# Altium footprint library ICL_connectors_v1.PcbLib: 86 footprints (part 4 of 6)
Each footprint in its own frame and in the unit in brackets; x right, y up, seen from the top. Pads: shape width x height; smd on the part's side, far side on the other; paste and mask are expansions set on the pad; w line width, h text height; cw(c..) or ccw(c..) is an arc to the next point about the centre after c.
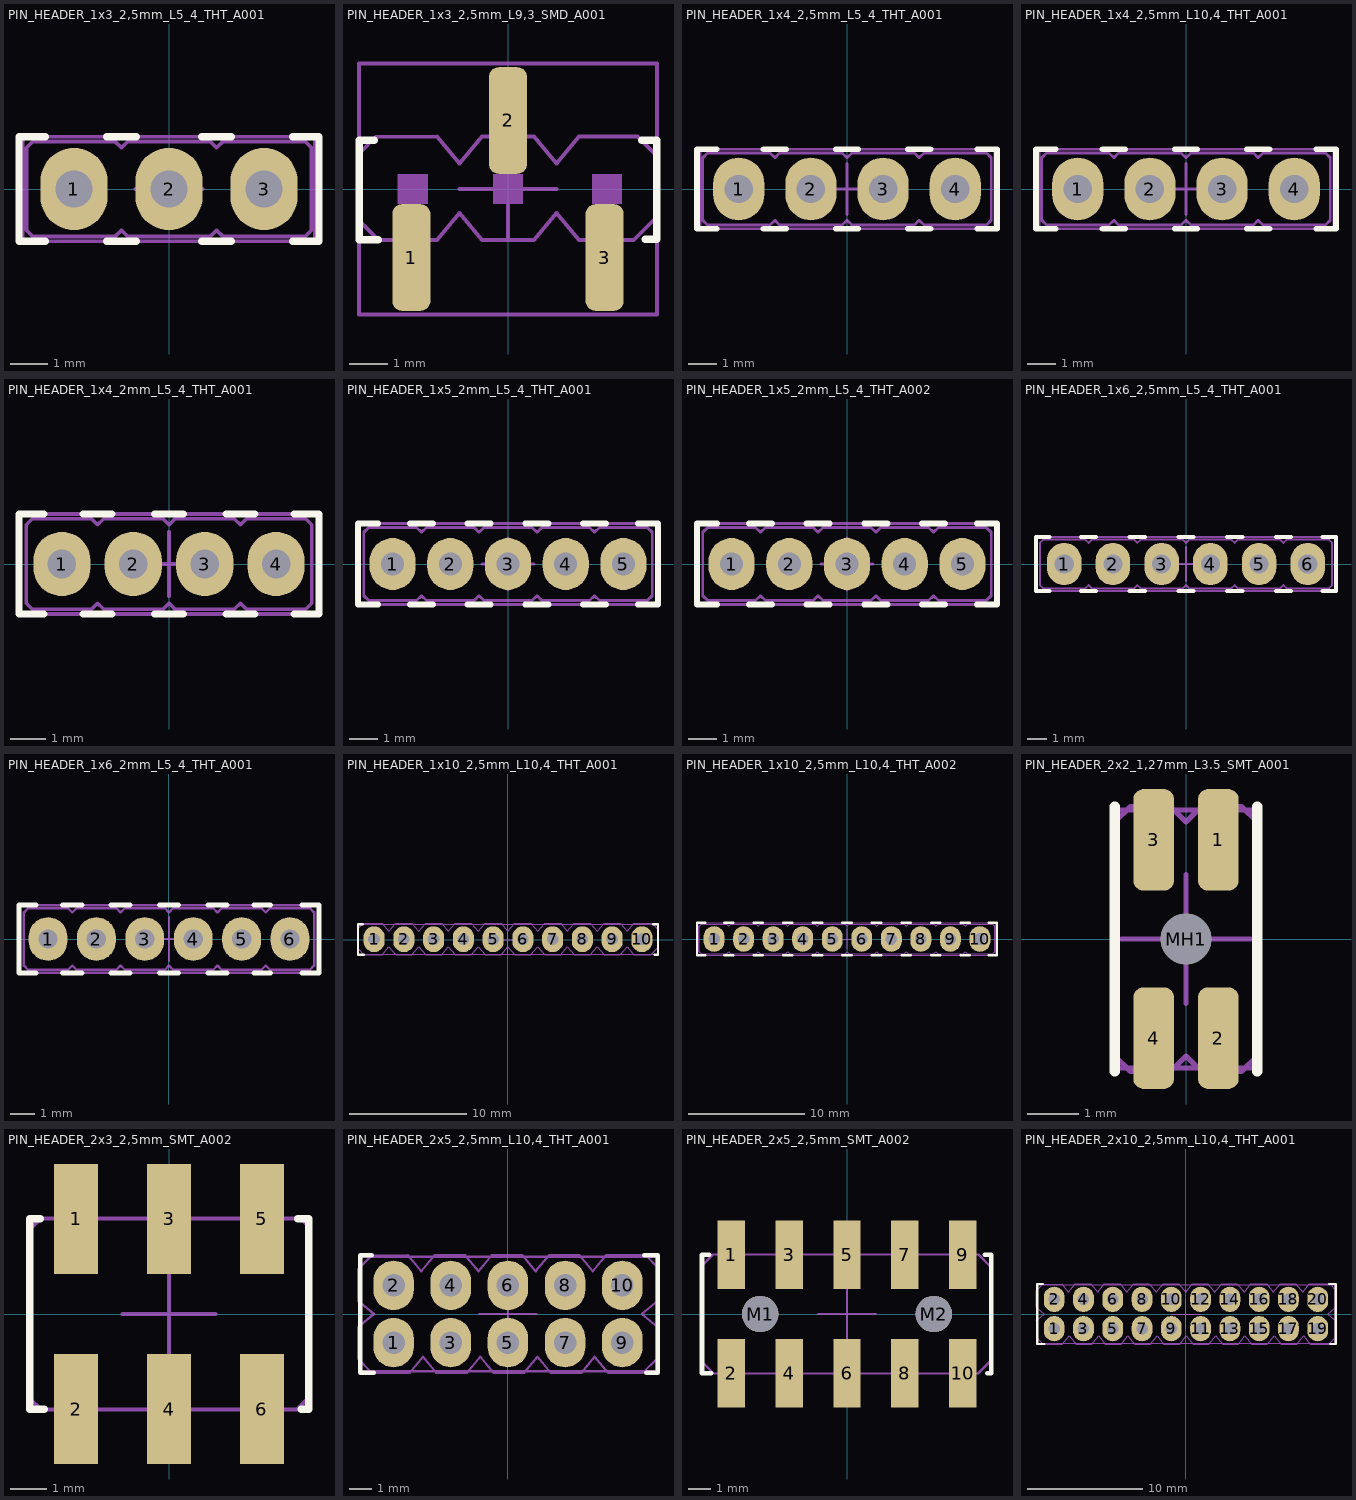
[diagram p3: the footprints below, top view; thin cyan lines are the x and y axes]

## PIN_HEADER_1x3_2,5mm_L5_4_THT_A001 [mm]
pads (3):
  oval 1.8x2.2 hole 1 paste-1: 1(-2.54,0) 2(0,0) 3(2.54,0)
Top Overlay:
  lines w0.2: -3.31,-1.4 -4.01,-1.4 -4.01,1.4 -3.31,1.4 ; -1.67,-1.4 -0.87,-1.4 ; -1.67,1.4 -0.87,1.4 ; 0.87,-1.4 1.67,-1.4 ; 0.87,1.4 1.67,1.4 ; 3.31,-1.4 4.01,-1.4 4.01,1.4 3.31,1.4
Top M15-16_SORG:
  lines w0.1: -0.9,0 0.9,0 ; 0,-0.9 0,0.9 ; -3.91,-1.4 3.9,-1.4 3.9,1.4 -3.91,1.4 -3.91,-1.4
Top M17-18_TDES:
  text "'.Designator'" at -5.665,2.183 h1
Top M19-20_TMOT:
  lines w0.1: -3.81,-1.1 -3.81,1.1 -3.64,1.27 -1.44,1.27 -1.27,1.1 -1.1,1.27 1.1,1.27 1.27,1.1 1.44,1.27 3.64,1.27 3.81,1.1 3.81,-1.1 3.64,-1.27 1.44,-1.27 1.27,-1.1 1.1,-1.27 -1.1,-1.27 -1.27,-1.1 -1.44,-1.27 -3.64,-1.27 -3.81,-1.1
3D body "color1x3 TH Pitch 2_54mm.stp": height 9.51, standoff -3.19, extent -3.81,-1.27 3.81,1.27

## PIN_HEADER_1x3_2,5mm_L9,3_SMD_A001 [mm]
pads (3):
  rrect50% 1x2.8 smd paste-1: 1(-2.54,-1.8) 2(0,1.8) 3(2.54,-1.8)
Top Overlay:
  lines w0.2: -3.51,1.278 -3.91,1.278 -3.91,-1.333 -3.41,-1.333 ; 3.51,1.285 3.91,1.285 3.91,-1.32 3.61,-1.32
Top M11-12_SMOT:
  rectangle: -0.3,1.4 0.3,2.7
  rectangle: -0.4,-0.4 0.4,0.4
  rectangle: 2.2,-0.4 3,0.4
  rectangle: -2.9,-0.4 -2.1,0.4
  region: 2.84,-1.338 2.24,-1.338 2.24,-2.7 2.84,-2.7
  region: -2.24,-1.338 -2.84,-1.338 -2.84,-2.7 -2.24,-2.7
  lines w0.1: -3.913,-0.827 -3.903,0.939 -3.472,1.372 -1.86,1.378 -1.27,0.67 -0.68,1.378 0.68,1.378 1.27,0.67 1.86,1.378 3.405,1.378 3.915,0.864 3.908,-0.732 3.302,-1.338 1.86,-1.338 1.27,-0.63 0.68,-1.338 -0.68,-1.338 -1.27,-0.63 -1.86,-1.338 -3.402,-1.338 -3.913,-0.827
Top M13-14_SDES:
  text "'.Designator'" at -5.665,4.283 h1
Top M15-16_SORG:
  lines w0.1: -1.27,0 0,0 ; 0,-1.27 0,0 ; 0,1.27 0,0 ; 1.27,0 0,0 ; -3.91,-3.3 3.91,-3.3 3.91,3.3 -3.91,3.3 -3.91,-3.3
3D body "pin_header_a-sl254-eg-g03mr1.stp": height 9.85, standoff 0.01, extent -3.81,-2.5 3.81,2.5

## PIN_HEADER_1x4_2,5mm_L5_4_THT_A001 [mm]
pads (4):
  oval 1.8x2.2 hole 1 paste-1: 1(-3.81,0) 2(-1.27,0) 3(1.27,0) 4(3.81,0)
Top Overlay:
  lines w0.2: -4.58,-1.4 -5.28,-1.4 -5.28,1.4 -4.58,1.4 ; -2.94,-1.4 -2.14,-1.4 ; -2.94,1.4 -2.14,1.4 ; -0.4,-1.4 0.4,-1.4 ; -0.4,1.4 0.4,1.4 ; 2.14,-1.4 2.94,-1.4 ; 2.14,1.4 2.94,1.4 ; 4.58,-1.4 5.28,-1.4 5.28,1.4 4.58,1.4
Top M15-16_SORG:
  lines w0.1: -0.9,0 0.9,0 ; 0,-0.9 0,0.9 ; -5.18,-1.4 5.2,-1.4 5.2,1.4 -5.18,1.4 -5.18,-1.4
Top M17-18_TDES:
  text "'.Designator'" at -5.665,2.183 h1
Top M19-20_TMOT:
  lines w0.1: -5.08,-1.1 -5.08,1.1 -4.91,1.27 -2.71,1.27 -2.54,1.1 -2.37,1.27 -0.17,1.27 0,1.1 0.17,1.27 2.37,1.27 2.54,1.1 2.71,1.27 4.91,1.27 5.08,1.1 5.08,-1.1 4.91,-1.27 2.71,-1.27 2.54,-1.1 2.37,-1.27 0.17,-1.27 0,-1.1 -0.17,-1.27 -2.37,-1.27 -2.54,-1.1 -2.71,-1.27 -4.91,-1.27 -5.08,-1.1
3D body "Header 4 Vertical.step": height 8.14, standoff -2.71, extent -4.872,-1.171 4.882,1.165

## PIN_HEADER_1x4_2,5mm_L10,4_THT_A001 [mm]
pads (4):
  oval 1.8x2.2 hole 1 paste-1: 1(-3.81,0) 2(-1.27,0) 3(1.27,0) 4(3.81,0)
Top Overlay:
  lines w0.2: -4.58,-1.4 -5.28,-1.4 -5.28,1.4 -4.58,1.4 ; -2.94,-1.4 -2.14,-1.4 ; -2.94,1.4 -2.14,1.4 ; -0.4,-1.4 0.4,-1.4 ; -0.4,1.4 0.4,1.4 ; 2.14,-1.4 2.94,-1.4 ; 2.14,1.4 2.94,1.4 ; 4.58,-1.4 5.28,-1.4 5.28,1.4 4.58,1.4
Top M15-16_SORG:
  lines w0.1: -0.9,0 0.9,0 ; 0,-0.9 0,0.9 ; -5.18,-1.4 -5.18,1.4 5.2,1.4 5.2,-1.4 -5.18,-1.4
Top M17-18_TDES:
  text "'.Designator'" at -5.665,2.183 h1
Top M19-20_TMOT:
  lines w0.1: -5.08,-1.1 -4.91,-1.27 -2.71,-1.27 -2.54,-1.1 -2.37,-1.27 -0.17,-1.27 0,-1.1 0.17,-1.27 2.37,-1.27 2.54,-1.1 2.71,-1.27 4.91,-1.27 5.08,-1.1 5.08,1.1 4.91,1.27 2.71,1.27 2.54,1.1 2.37,1.27 0.17,1.27 0,1.1 -0.17,1.27 -2.37,1.27 -2.54,1.1 -2.71,1.27 -4.91,1.27 -5.08,1.1 -5.08,-1.1
3D body "PIN_HEADER_2_54_1x4_double.stp": height 16.41, standoff -2.99, extent -5.06,-1.27 5.06,1.27

## PIN_HEADER_1x4_2mm_L5_4_THT_A001 [mm]
pads (4):
  oval 1.6x1.8 hole 0.8 paste-1: 1(-3,0) 2(-1,0) 3(1,0) 4(3,0)
Top Overlay:
  lines w0.2: -3.5,-1.4 -4.2,-1.4 -4.2,1.4 -3.5,1.4 ; -2.4,-1.4 -1.6,-1.4 ; -2.4,1.4 -1.6,1.4 ; -0.4,-1.4 0.4,-1.4 ; -0.4,1.4 0.4,1.4 ; 1.6,-1.4 2.4,-1.4 ; 1.6,1.4 2.4,1.4 ; 3.5,-1.4 4.2,-1.4 4.2,1.4 3.5,1.4
Top M15-16_SORG:
  lines w0.1: -0.9,0 0.9,0 ; 0,-0.9 0,0.9 ; -4.2,-1.4 4.2,-1.4 4.2,1.4 -4.2,1.4 -4.2,-1.4
Top M17-18_TDES:
  text "'.Designator'" at -5.665,2.183 h1
Top M19-20_TMOT:
  lines w0.1: -1.83,1.27 -2,1.1 -2.17,1.27 -3.83,1.27 -4,1.1 -4,-1.1 -3.83,-1.27 -2.17,-1.27 -2,-1.1 -1.83,-1.27 -0.17,-1.27 0,-1.1 0.17,-1.27 1.83,-1.27 2,-1.1 2.17,-1.27 3.83,-1.27 4,-1.1 4,1.1 3.83,1.27 2.17,1.27 2,1.1 1.83,1.27 0.17,1.27 0,1.1 -0.17,1.27 -1.83,1.27 ; -1.83,1.27 -1.83,1.27
3D body "Download_STP_62000411121 (rev1).stp": height 6.01, standoff -2.69, extent -4,-1 4,1

## PIN_HEADER_1x5_2mm_L5_4_THT_A001 [mm]
pads (5):
  oval 1.6x1.8 hole 0.8 paste-1: 1(-4,0) 2(-2,0) 3(0,0) 4(2,0) 5(4,0)
Top Overlay:
  lines w0.2: -4.5,-1.4 -5.2,-1.4 -5.2,1.4 -4.5,1.4 ; -3.4,-1.4 -2.6,-1.4 ; -3.4,1.4 -2.6,1.4 ; -1.4,-1.4 -0.6,-1.4 ; -1.4,1.4 -0.6,1.4 ; 0.6,-1.4 1.4,-1.4 ; 0.6,1.4 1.4,1.4 ; 2.6,-1.4 3.4,-1.4 ; 2.6,1.4 3.4,1.4 ; 4.5,-1.4 5.2,-1.4 5.2,1.4 4.5,1.4
Top M15-16_SORG:
  lines w0.1: -0.9,0 0.9,0 ; 0,-0.9 0,0.9 ; -5.2,-1.4 -5.2,1.4 5.2,1.4 5.2,-1.4 -5.2,-1.4
Top M17-18_TDES:
  text "'.Designator'" at -5.865,2.083 h1
Top M19-20_TMOT:
  lines w0.1: -2.83,1.27 -1.17,1.27 -1,1.1 -0.83,1.27 0.83,1.27 1,1.1 1.17,1.27 2.83,1.27 3,1.1 3.17,1.27 4.83,1.27 5,1.1 5,-1.1 4.83,-1.27 3.17,-1.27 3,-1.1 2.83,-1.27 1.17,-1.27 1,-1.1 0.83,-1.27 -0.83,-1.27 -1,-1.1 -1.17,-1.27 -2.83,-1.27 -3,-1.1 -3.17,-1.27 -4.83,-1.27 -5,-1.1 -5,1.1 -4.83,1.27 -3.17,1.27 -3,1.1 -2.83,1.27 ; -2.83,1.27 -2.83,1.27
3D body "Download_STP_62000411121 (rev1).stp": height 6.01, standoff -2.69, extent -3,-1 5,1
3D body "Download_STP_62000411121 (rev1).stp": height 6.01, standoff -2.69, extent -5,-1 3,1

## PIN_HEADER_1x5_2mm_L5_4_THT_A002 [mm]
pads (5):
  oval 1.6x1.8 hole 0.8 paste-1: 1(-4,0) 2(-2,0) 3(0,0) 4(2,0) 5(4,0)
Top Overlay:
  lines w0.2: -4.5,-1.4 -5.2,-1.4 -5.2,1.4 -4.5,1.4 ; -3.4,-1.4 -2.6,-1.4 ; -3.4,1.4 -2.6,1.4 ; -1.4,-1.4 -0.6,-1.4 ; -1.4,1.4 -0.6,1.4 ; 0.6,-1.4 1.4,-1.4 ; 0.6,1.4 1.4,1.4 ; 2.6,-1.4 3.4,-1.4 ; 2.6,1.4 3.4,1.4 ; 4.5,-1.4 5.2,-1.4 5.2,1.4 4.5,1.4
Top M15-16_SORG:
  lines w0.1: -0.9,0 0.9,0 ; 0,-0.9 0,0.9 ; -5.2,-1.4 -5.2,1.4 5.2,1.4 5.2,-1.4 -5.2,-1.4
Top M17-18_TDES:
  text "'.Designator'" at -5.865,2.083 h1
Top M19-20_TMOT:
  lines w0.1: -2.83,1.27 -1.17,1.27 -1,1.1 -0.83,1.27 0.83,1.27 1,1.1 1.17,1.27 2.83,1.27 3,1.1 3.17,1.27 4.83,1.27 5,1.1 5,-1.1 4.83,-1.27 3.17,-1.27 3,-1.1 2.83,-1.27 1.17,-1.27 1,-1.1 0.83,-1.27 -0.83,-1.27 -1,-1.1 -1.17,-1.27 -2.83,-1.27 -3,-1.1 -3.17,-1.27 -4.83,-1.27 -5,-1.1 -5,1.1 -4.83,1.27 -3.17,1.27 -3,1.1 -2.83,1.27 ; -2.83,1.27 -2.83,1.27
3D body: height 1, standoff 0, extent 3.5,-0.5 4.5,0.5
3D body: height 1, standoff 0, extent 1.5,-0.5 2.5,0.5
3D body: height 1, standoff 0, extent -0.5,-0.5 0.5,0.5
3D body: height 1, standoff 0, extent -2.5,-0.5 -1.5,0.5
3D body: height 1, standoff 0, extent -4.5,-0.5 -3.5,0.5

## PIN_HEADER_1x6_2,5mm_L5_4_THT_A001 [mm]
pads (6):
  oval 1.8x2.2 hole 1 paste-1: 1(-6.35,0) 2(-3.81,0) 3(-1.27,0) 4(1.27,0) 5(3.81,0) 6(6.35,0)
Top Overlay:
  lines w0.2: -7.12,-1.4 -7.82,-1.4 -7.82,1.4 -7.12,1.4 ; -5.48,-1.4 -4.68,-1.4 ; -5.48,1.4 -4.68,1.4 ; -2.94,-1.4 -2.14,-1.4 ; -2.94,1.4 -2.14,1.4 ; -0.4,-1.4 0.4,-1.4 ; -0.4,1.4 0.4,1.4 ; 2.14,-1.4 2.94,-1.4 ; 2.14,1.4 2.94,1.4 ; 4.68,-1.4 5.48,-1.4 ; 4.68,1.4 5.48,1.4 ; 7.12,-1.4 7.82,-1.4 7.82,1.4 7.12,1.4
Top M15-16_SORG:
  lines w0.1: -0.9,0 0.9,0 ; 0,-0.9 0,0.9 ; -7.8,-1.4 -7.8,1.4 7.8,1.4 7.8,-1.4 -7.8,-1.4
Top M17-18_TDES:
  text "'.Designator'" at -5.665,2.183 h1
Top M19-20_TMOT:
  lines w0.1: -7.62,-1.1 -7.45,-1.27 -5.25,-1.27 -5.08,-1.1 -4.91,-1.27 -2.71,-1.27 -2.54,-1.1 -2.37,-1.27 -0.17,-1.27 0,-1.1 0.17,-1.27 2.37,-1.27 2.54,-1.1 2.71,-1.27 4.91,-1.27 5.08,-1.1 5.25,-1.27 7.45,-1.27 7.62,-1.1 7.62,1.1 7.45,1.27 5.25,1.27 5.08,1.1 4.91,1.27 2.71,1.27 2.54,1.1 2.37,1.27 0.17,1.27 0,1.1 -0.17,1.27 -2.37,1.27 -2.54,1.1 -2.71,1.27 -4.91,1.27 -5.08,1.1 -5.25,1.27 -7.45,1.27 -7.62,1.1 -7.62,-1.1
3D body "Header 4 Vertical.step": height 8.14, standoff -2.71, extent -7.412,-1.171 2.342,1.165
3D body "Header 4 Vertical.step": height 8.14, standoff -2.71, extent -2.332,-1.171 7.422,1.165

## PIN_HEADER_1x6_2mm_L5_4_THT_A001 [mm]
pads (6):
  oval 1.6x1.8 hole 0.8 paste-1: 1(-5,0) 2(-3,0) 3(-1,0) 4(1,0) 5(3,0) 6(5,0)
Top Overlay:
  lines w0.2: -5.5,-1.4 -6.2,-1.4 -6.2,1.4 -5.5,1.4 ; -4.4,-1.4 -3.6,-1.4 ; -4.4,1.4 -3.6,1.4 ; -2.4,-1.4 -1.6,-1.4 ; -2.4,1.4 -1.6,1.4 ; -0.4,-1.4 0.4,-1.4 ; -0.4,1.4 0.4,1.4 ; 1.6,-1.4 2.4,-1.4 ; 1.6,1.4 2.4,1.4 ; 3.5,-1.4 4.2,-1.4 ; 3.5,1.4 4.2,1.4 ; 5.5,-1.4 6.2,-1.4 6.2,1.4 5.5,1.4
Top M15-16_SORG:
  lines w0.1: -0.9,0 0.9,0 ; 0,-0.9 0,0.9 ; -6.2,-1.4 -6.2,1.4 6.2,1.4 6.2,-1.4 -6.2,-1.4
Top M17-18_TDES:
  text "'.Designator'" at -5.665,2.083 h1
Top M19-20_TMOT:
  lines w0.1: -3.83,1.27 -2.17,1.27 -2,1.1 -1.83,1.27 -0.17,1.27 0,1.1 0.17,1.27 1.83,1.27 2,1.1 2.17,1.27 3.83,1.27 4,1.1 4.17,1.27 5.83,1.27 6,1.1 6,-1.1 5.83,-1.27 4.17,-1.27 4,-1.1 3.83,-1.27 2.17,-1.27 2,-1.1 1.83,-1.27 0.17,-1.27 0,-1.1 -0.17,-1.27 -1.83,-1.27 -2,-1.1 -2.17,-1.27 -3.83,-1.27 -4,-1.1 -4.17,-1.27 -5.83,-1.27 -6,-1.1 -6,1.1 -5.83,1.27 -4.17,1.27 -4,1.1 -3.83,1.27 ; -3.83,1.27 -3.83,1.27
3D body "Download_STP_62000411121 (rev1).stp": height 6.01, standoff -2.69, extent -2,-1 6,1
3D body "Download_STP_62000411121 (rev1).stp": height 6.01, standoff -2.69, extent -6,-1 2,1

## PIN_HEADER_1x10_2,5mm_L10,4_THT_A001 [mm]
pads (10):
  oval 1.8x2.2 hole 1 paste-1: 1(-11.43,0.03) 2(-8.89,0.03) 3(-6.35,0.03) 4(-3.81,0.03) 5(-1.27,0.03) 6(1.27,0.03) 7(3.81,0.03) 8(6.35,0.03) 9(8.89,0.03) 10(11.43,0.03)
Top Overlay:
  lines w0.2: -12.4,1.308 -12.8,1.308 -12.8,-1.303 -12.3,-1.303 ; 12.4,1.315 12.8,1.315 12.8,-1.29 12.5,-1.29
Top M15-16_SORG:
  lines w0.1: -1.27,0 0,0 ; 0,-1.27 0,0 ; 0,1.27 0,0 ; 1.27,0 0,0 ; -12.8,-1.27 -12.8,1.3 12.8,1.3 12.8,-1.27 -12.8,-1.27
Top M17-18_TDES:
  text "'.Designator'" at -5.665,2.283 h1
Top M19-20_TMOT:
  lines w0.1: -12.803,-0.797 -12.292,-1.308 -10.75,-1.308 -10.16,-0.6 -9.57,-1.308 -8.21,-1.308 -7.62,-0.6 -7.03,-1.308 -5.67,-1.308 -5.08,-0.6 -4.49,-1.308 -3.13,-1.308 -2.54,-0.6 -1.95,-1.308 -0.59,-1.308 0,-0.6 0.59,-1.308 1.95,-1.308 2.54,-0.6 3.13,-1.308 4.49,-1.308 5.08,-0.6 5.67,-1.308 7.03,-1.308 7.62,-0.6 8.21,-1.308 9.57,-1.308 10.16,-0.6 10.75,-1.308 12.192,-1.308 12.798,-0.702 12.805,0.894 12.295,1.408 10.75,1.408 10.16,0.7 9.57,1.408 8.21,1.408 7.62,0.7 7.03,1.408 5.67,1.408 5.08,0.7 4.49,1.408 3.13,1.408 2.54,0.7 1.95,1.408 0.59,1.408 0,0.7 -0.59,1.408 -1.95,1.408 -2.54,0.7 -3.13,1.408 -4.49,1.408 -5.08,0.7 -5.67,1.408 -7.03,1.408 -7.62,0.7 -8.21,1.408 -9.57,1.408 -10.16,0.7 -10.75,1.408 -12.362,1.402 -12.793,0.969 -12.803,-0.797
3D body "idc_1x10_2_54_10_4mm.STEP": height 16.41, standoff -2.99, extent -12.7,-1.27 12.7,1.33

## PIN_HEADER_1x10_2,5mm_L10,4_THT_A002 [mm]
pads (10):
  oval 1.8x2.2 hole 1 paste-1: 1(-11.43,0) 2(-8.89,0) 3(-6.35,0) 4(-3.81,0) 5(-1.27,0) 6(1.27,0) 7(3.81,0) 8(6.35,0) 9(8.89,0) 10(11.43,0)
Top Overlay:
  lines w0.2: -12.2,-1.4 -12.9,-1.4 -12.9,1.4 -12.2,1.4 ; -10.56,-1.4 -9.76,-1.4 ; -10.56,1.4 -9.76,1.4 ; -8.02,-1.4 -7.22,-1.4 ; -8.02,1.4 -7.22,1.4 ; -5.48,-1.4 -4.68,-1.4 ; -5.48,1.4 -4.68,1.4 ; -2.94,-1.4 -2.14,-1.4 ; -2.94,1.4 -2.14,1.4 ; -0.4,-1.4 0.4,-1.4 ; -0.4,1.4 0.4,1.4 ; 2.14,-1.4 2.94,-1.4 ; 2.14,1.4 2.94,1.4 ; 4.68,-1.4 5.48,-1.4 ; 4.68,1.4 5.48,1.4 ; 7.22,-1.4 8.02,-1.4 ; 7.22,1.4 8.02,1.4 ; 9.76,-1.4 10.56,-1.4 ; 9.76,1.4 10.56,1.4 ; 12.2,-1.4 12.9,-1.4 12.9,1.4 12.2,1.4
Top M15-16_SORG:
  lines w0.1: -0.9,0 0.9,0 ; 0,-0.9 0,0.9 ; -12.8,-1.4 12.8,-1.4 12.8,1.4 -12.8,1.4 -12.8,-1.4
Top M17-18_TDES:
  text "'.Designator'" at -5.665,2.183 h1
Top M19-20_TMOT:
  lines w0.1: -12.7,-1.1 -12.53,-1.27 -10.33,-1.27 -10.16,-1.1 -9.99,-1.27 -7.79,-1.27 -7.62,-1.1 -7.45,-1.27 -5.25,-1.27 -5.08,-1.1 -4.91,-1.27 -2.71,-1.27 -2.54,-1.1 -2.37,-1.27 -0.17,-1.27 0,-1.1 0.17,-1.27 2.37,-1.27 2.54,-1.1 2.71,-1.27 4.91,-1.27 5.08,-1.1 5.25,-1.27 7.45,-1.27 7.62,-1.1 7.79,-1.27 9.99,-1.27 10.16,-1.1 10.33,-1.27 12.53,-1.27 12.7,-1.1 12.7,1.1 12.53,1.27 10.33,1.27 10.16,1.1 9.99,1.27 7.79,1.27 7.62,1.1 7.45,1.27 5.25,1.27 5.08,1.1 4.91,1.27 2.71,1.27 2.54,1.1 2.37,1.27 0.17,1.27 0,1.1 -0.17,1.27 -2.37,1.27 -2.54,1.1 -2.71,1.27 -4.91,1.27 -5.08,1.1 -5.25,1.27 -7.45,1.27 -7.62,1.1 -7.79,1.27 -9.99,1.27 -10.16,1.1 -10.33,1.27 -12.53,1.27 -12.7,1.1 -12.7,-1.1
3D body "PIN_HEADER_2_54_1x10_double_10_4.stp": height 16.41, standoff -2.99, extent -12.68,-1.27 12.68,1.27

## PIN_HEADER_2x2_1,27mm_L3.5_SMT_A001 [mm]
pads (5):
  rrect50% 0.8x2 smd: 1(0.635,1.95)
  rrect50% 0.8x2 smd paste-1: 2(0.635,-1.95) 3(-0.635,1.95) 4(-0.635,-1.95)
  round 1 hole 1 unplated: MH1(0,0)
Top Overlay:
  lines w0.2: -1.4,-2.6 -1.4,2.6 ; 1.4,-2.6 1.4,2.6
Top M13-14_SDES:
  text "'.Designator'" at -5.665,3.283 h1
Top M15-16_SORG:
  lines w0.1: -1.27,0 0,0 ; 0,-1.27 0,0 ; 0,1.27 0,0 ; 1.27,0 0,0 ; -1.4,-2.54 1.4,-2.54 1.4,2.54 -1.4,2.54 -1.4,-2.54
Top M19-20_TMOT:
  rectangle: -0.9,1.3 -0.4,2.8
  rectangle: 0.37,1.3 0.87,2.8
  region: -0.37,-1.3 -0.87,-1.3 -0.87,-2.8 -0.37,-2.8
  region: 0.9,-1.3 0.4,-1.3 0.4,-2.8 0.9,-2.8
  lines w0.1: -1.4,-2.3 -1.092,-2.608 -0.308,-2.608 0,-2.3 0.308,-2.608 1.092,-2.608 1.4,-2.3 1.4,2.3 1.092,2.608 0.308,2.608 0,2.3 -0.308,2.608 -1.092,2.608 -1.4,2.3 -1.4,-2.3
3D body "62100421021 (rev1).stp": height 5.92, standoff 0.01, extent -1.27,-2.5 1.27,2.5

## PIN_HEADER_2x3_2,5mm_SMT_A002 [mm]
pads (6):
  rect 1.2x3 smd paste-1: 1(-2.54,2.6) 2(-2.54,-2.6) 3(0,2.6) 4(0,-2.6) 5(2.54,2.6) 6(2.54,-2.6)
Top Overlay:
  lines w0.2: -3.51,2.6 -3.806,2.6 -3.806,-2.6 -3.41,-2.6 ; 3.51,2.6 3.82,2.6 3.82,-2.6 3.61,-2.6
Top M11-12_SMOT:
  lines w0.1: -3.515,2.608 3.61,2.608 ; -3.512,2.602 -3.819,2.293 -3.792,-2.318 -3.502,-2.608 ; -3.51,-2.608 3.502,-2.608 3.816,-2.294 3.836,2.372 3.61,2.6
Top M13-14_SDES:
  text "'.Designator'" at -5.665,-0.417 h1
Top M15-16_SORG:
  lines w0.1: -1.27,0 0,0 ; 0,-1.27 0,0 ; 0,1.27 0,0 ; 1.27,0 0,0
3D body "15910060_v2.stp": height 9.66, standoff 0.01, extent -3.81,-3.492 3.81,3.492

## PIN_HEADER_2x5_2,5mm_L10,4_THT_A001 [mm]
pads (10):
  oval 1.8x2.2 hole 1 paste-1: 1(-5.08,-1.27) 2(-5.08,1.27) 3(-2.54,-1.27) 4(-2.54,1.27) 5(0,-1.27) 6(0,1.27) 7(2.54,-1.27) 8(2.54,1.27) 9(5.08,-1.27) 10(5.08,1.27)
Top Overlay:
  lines w0.2: -6.05,2.6 -6.55,2.6 -6.55,-2.6 -5.95,-2.6 ; 6.05,2.6 6.65,2.6 6.65,-2.6 6.15,-2.6
Top M15-16_SORG:
  lines w0.1: -1.27,0 0,0 ; 0,-1.27 0,0 ; 0,1.27 0,0 ; 1.27,0 0,0 ; -6.6,-2.54 -6.6,2.54 6.6,2.54 6.6,-2.54 -6.6,-2.54
Top M17-18_TDES:
  text "'.Designator'" at -5.665,3.383 h1
Top M19-20_TMOT:
  lines w0.1: -6.658,-0.59 -5.95,0 -6.658,0.59 -6.65,2 -6.052,2.602 -4.44,2.608 -3.85,1.9 -3.26,2.608 -1.9,2.608 -1.31,1.9 -0.72,2.608 0.64,2.608 1.23,1.9 1.82,2.608 3.18,2.608 3.77,1.9 4.36,2.608 6.12,2.608 6.664,2.059 6.658,0.59 5.95,0 6.658,-0.59 6.651,-1.949 5.992,-2.608 4.44,-2.608 3.85,-1.9 3.26,-2.608 1.9,-2.608 1.31,-1.9 0.72,-2.608 -0.64,-2.608 -1.23,-1.9 -1.82,-2.608 -3.18,-2.608 -3.77,-1.9 -4.36,-2.608 -6.042,-2.608 -6.65,-2 -6.658,-0.59
3D body "idc_2x5_2_54_10_4mm.STEP": height 16.41, standoff -2.99, extent -6.336,-2.596 6.364,2.544

## PIN_HEADER_2x5_2,5mm_SMT_A002 [mm]
pads (12):
  rect 1.2x3 smd paste-1: 1(-5.08,2.6) 2(-5.08,-2.6) 3(-2.54,2.6) 4(-2.54,-2.6) 5(0,2.6) 6(0,-2.6) 7(2.54,2.6) 8(2.54,-2.6) 9(5.08,2.6) 10(5.08,-2.6)
  round 1.6 hole 1.6 unplated mask+0: M1(-3.81,0) M2(3.81,0)
Top Overlay:
  lines w0.2: -6.05,2.6 -6.36,2.6 -6.36,-2.6 -5.95,-2.6 ; 6.05,2.6 6.332,2.6 6.332,-2.6 6.15,-2.6
Top M11-12_SMOT:
  lines w0.1: -6.405,2.075 -5.876,2.608 5.764,2.608 6.313,2.055 6.295,-2.063 5.75,-2.608 -5.842,-2.608 -6.38,-2.069 -6.405,2.075
Top M13-14_SDES:
  text "'.Designator'" at -5.665,-0.417 h1
Top M15-16_SORG:
  lines w0.1: -1.27,0 0,0 ; 0,-1.27 0,0 ; 0,1.27 0,0 ; 1.27,0 0,0
3D body "15910100_v2.stp": height 9.66, standoff 0.01, extent -6.35,-3.492 6.35,3.492

## PIN_HEADER_2x10_2,5mm_L10,4_THT_A001 [mm]
pads (20):
  oval 1.8x2.2 hole 1 paste-1: 1(-11.43,-1.27) 2(-11.43,1.27) 3(-8.89,-1.27) 4(-8.89,1.27) 5(-6.35,-1.27) 6(-6.35,1.27) 7(-3.81,-1.27) 8(-3.81,1.27) 9(-1.27,-1.27) 10(-1.27,1.27) 11(1.27,-1.27) 12(1.27,1.27) 13(3.81,-1.27) 14(3.81,1.27) 15(6.35,-1.27) 16(6.35,1.27) 17(8.89,-1.27) 18(8.89,1.27) 19(11.43,-1.27) 20(11.43,1.27)
Top Overlay:
  lines w0.2: -12.4,2.6 -12.9,2.6 -12.9,-2.6 -12.3,-2.6 ; 12.4,2.6 13,2.6 13,-2.6 12.5,-2.6
Top M15-16_SORG:
  lines w0.1: -1.27,0 0,0 ; 0,-1.27 0,0 ; 0,1.27 0,0 ; 1.27,0 0,0 ; -12.95,-2.54 12.95,-2.54 12.95,2.54 -12.95,2.54 -12.95,-2.54
Top M17-18_TDES:
  text "'.Designator'" at -5.665,3.283 h1
Top M19-20_TMOT:
  lines w0.1: 12.5,2.6 13.015,2.081 13.008,0.59 12.3,0 13.008,-0.59 13.001,-1.999 12.392,-2.608 10.79,-2.608 10.2,-1.9 9.61,-2.608 8.25,-2.608 7.66,-1.9 7.07,-2.608 5.71,-2.608 5.12,-1.9 4.53,-2.608 3.17,-2.608 2.58,-1.9 1.99,-2.608 0.63,-2.608 0.04,-1.9 -0.55,-2.608 -1.91,-2.608 -2.5,-1.9 -3.09,-2.608 -4.45,-2.608 -5.04,-1.9 -5.63,-2.608 -6.99,-2.608 -7.58,-1.9 -8.17,-2.608 -9.53,-2.608 -10.12,-1.9 -10.71,-2.608 -12.392,-2.608 -13,-2 -13.008,-0.59 -12.3,0 -13.008,0.59 -13,2 -12.402,2.602 -10.79,2.608 -10.2,1.9 -9.61,2.608 -8.25,2.608 -7.66,1.9 -7.07,2.608 -5.71,2.608 -5.12,1.9 -4.53,2.608 -3.17,2.608 -2.58,1.9 -1.99,2.608 -0.63,2.608 -0.04,1.9 0.55,2.608 1.91,2.608 2.5,1.9 3.09,2.608 4.45,2.608 5.04,1.9 5.63,2.608 6.99,2.608 7.58,1.9 8.17,2.608 9.53,2.608 10.12,1.9 10.71,2.608 12.5,2.608
3D body "idc_2x10_2_54_10_4mm.STEP": height 16.41, standoff -2.99, extent -12.686,-2.556 12.714,2.584